# Altium schematic symbol library jlcpcb_2025_04_capacitors_extended_0201.schlib: 1175 symbols (part 7 of 7) (continued)
## V1R5B0201HQC250NAT
designator C?  Capacitance: 1.5pF  (hidden comment: *)
Capacitor, Ceramic (MLCC), 1.5pF, 25V, SMD 0201; Manufacturer: VIIYONG; Manufacturer Part Number: V1R5B0201HQC250NAT; Package Size: 0201; JLCPCB Basic Part: No; JLCPCB Part Number: C2844460; Supplier 1: LCSC; Category: Capacitors - MLCC; Supplier Part Number 1: C2844460; Voltage Rating: 25V; RoHS: Yes; ComponentLink1Description: Datasheet; ComponentLink1URL: https://wmsc.lcsc.com/wmsc/upload/file/pdf/v2/lcsc/2202132030_VIIYONG-V1R5B0201HQC250NAT_C2844460.pdf; ComponentLink2Description: JLCPCB Part URL; ComponentLink2URL: https://jlcpcb.com/partdetail/C2844460; ComponentLink3Description: LCSC Part URL; ComponentLink3URL: https://lcsc.com/product-detail/Multilayer-Ceramic-Capacitors-MLCC---SMD-SMT_VIIYONG-VIIYONG-V1R5B0201HQC250NAT_C2844460.html
footprint CAP-0201 (0201 (0603M) Capacitor)
pins: 1, 2

## V1R5B0201HQC500NAT
designator C?  Capacitance: 1.5pF  (hidden comment: *)
Capacitor, Ceramic (MLCC), 1.5pF, 50V, HQC, SMD 0201; Manufacturer: VIIYONG; Manufacturer Part Number: V1R5B0201HQC500NAT; Package Size: 0201; JLCPCB Basic Part: No; JLCPCB Part Number: C2975895; Supplier 1: LCSC; Category: Capacitors - MLCC; Supplier Part Number 1: C2975895; Voltage Rating: 50V; Temperature Coefficient: HQC; RoHS: Yes; ComponentLink1Description: Datasheet; ComponentLink1URL: https://wmsc.lcsc.com/wmsc/upload/file/pdf/v2/lcsc/2202181430_VIIYONG-V1R5B0201HQC500NAT_C2975895.pdf; ComponentLink2Description: JLCPCB Part URL; ComponentLink2URL: https://jlcpcb.com/partdetail/C2975895; ComponentLink3Description: LCSC Part URL; ComponentLink3URL: https://lcsc.com/product-detail/Multilayer-Ceramic-Capacitors-MLCC---SMD-SMT_VIIYONG-VIIYONG-V1R5B0201HQC500NAT_C2975895.html
footprint CAP-0201 (0201 (0603M) Capacitor)
pins: 1, 2

## V2R7C0201C0G500NAT
designator C?  Capacitance: 2.7pF  (hidden comment: *)
Capacitor, Ceramic (MLCC), 2.7pF, 50V, C0G, SMD 0201; Manufacturer: VIIYONG; Manufacturer Part Number: V2R7C0201C0G500NAT; Package Size: 0201; JLCPCB Basic Part: No; JLCPCB Part Number: C513410; Supplier 1: LCSC; Category: Capacitors - MLCC; Supplier Part Number 1: C513410; Voltage Rating: 50V; Temperature Coefficient: C0G; RoHS: Yes; ComponentLink1Description: Datasheet; ComponentLink1URL: https://wmsc.lcsc.com/wmsc/upload/file/pdf/v2/lcsc/2304140030_VIIYONG-V2R7C0201C0G500NAT_C513410.pdf; ComponentLink2Description: JLCPCB Part URL; ComponentLink2URL: https://jlcpcb.com/partdetail/C513410; ComponentLink3Description: LCSC Part URL; ComponentLink3URL: https://lcsc.com/product-detail/Multilayer-Ceramic-Capacitors-MLCC---SMD-SMT_VIIYONG-VIIYONG-V2R7C0201C0G500NAT_C513410.html
footprint CAP-0201 (0201 (0603M) Capacitor)
pins: 1, 2

## V3R0B0201C0G500NAT
designator C?  Capacitance: 3pF  (hidden comment: *)
Capacitor, Ceramic (MLCC), 3pF, 50V, C0G, SMD 0201; Manufacturer: VIIYONG; Manufacturer Part Number: V3R0B0201C0G500NAT; Package Size: 0201; JLCPCB Basic Part: No; JLCPCB Part Number: C513421; Supplier 1: LCSC; Category: Capacitors - MLCC; Supplier Part Number 1: C513421; Voltage Rating: 50V; Temperature Coefficient: C0G; RoHS: Yes; ComponentLink1Description: Datasheet; ComponentLink1URL: https://wmsc.lcsc.com/wmsc/upload/file/pdf/v2/lcsc/2304140030_VIIYONG-V3R0B0201C0G500NAT_C513421.pdf; ComponentLink2Description: JLCPCB Part URL; ComponentLink2URL: https://jlcpcb.com/partdetail/C513421; ComponentLink3Description: LCSC Part URL; ComponentLink3URL: https://lcsc.com/product-detail/Multilayer-Ceramic-Capacitors-MLCC---SMD-SMT_VIIYONG-VIIYONG-V3R0B0201C0G500NAT_C513421.html
footprint CAP-0201 (0201 (0603M) Capacitor)
pins: 1, 2

## V3R0B0201HQC500NAT
designator C?  Capacitance: 3pF  (hidden comment: *)
Capacitor, Ceramic (MLCC), 3pF, 50V, HQC, SMD 0201; Manufacturer: VIIYONG; Manufacturer Part Number: V3R0B0201HQC500NAT; Package Size: 0201; JLCPCB Basic Part: No; JLCPCB Part Number: C2975894; Supplier 1: LCSC; Category: Capacitors - MLCC; Supplier Part Number 1: C2975894; Voltage Rating: 50V; Temperature Coefficient: HQC; RoHS: Yes; ComponentLink1Description: Datasheet; ComponentLink1URL: https://wmsc.lcsc.com/wmsc/upload/file/pdf/v2/lcsc/2202181430_VIIYONG-V3R0B0201HQC500NAT_C2975894.pdf; ComponentLink2Description: JLCPCB Part URL; ComponentLink2URL: https://jlcpcb.com/partdetail/C2975894; ComponentLink3Description: LCSC Part URL; ComponentLink3URL: https://lcsc.com/product-detail/Multilayer-Ceramic-Capacitors-MLCC---SMD-SMT_VIIYONG-VIIYONG-V3R0B0201HQC500NAT_C2975894.html
footprint CAP-0201 (0201 (0603M) Capacitor)
pins: 1, 2

## V3R0C0201C0G500NAT
designator C?  Capacitance: 3pF  (hidden comment: *)
Capacitor, Ceramic (MLCC), 3pF, 50V, C0G, SMD 0201; Manufacturer: VIIYONG; Manufacturer Part Number: V3R0C0201C0G500NAT; Package Size: 0201; JLCPCB Basic Part: No; JLCPCB Part Number: C525055; Supplier 1: LCSC; Category: Capacitors - MLCC; Supplier Part Number 1: C525055; Voltage Rating: 50V; Temperature Coefficient: C0G; RoHS: Yes; ComponentLink1Description: Datasheet; ComponentLink1URL: https://wmsc.lcsc.com/wmsc/upload/file/pdf/v2/lcsc/2304140030_VIIYONG-V3R0C0201C0G500NAT_C525055.pdf; ComponentLink2Description: JLCPCB Part URL; ComponentLink2URL: https://jlcpcb.com/partdetail/C525055; ComponentLink3Description: LCSC Part URL; ComponentLink3URL: https://lcsc.com/product-detail/Multilayer-Ceramic-Capacitors-MLCC---SMD-SMT_VIIYONG-VIIYONG-V3R0C0201C0G500NAT_C525055.html
footprint CAP-0201 (0201 (0603M) Capacitor)
pins: 1, 2

## V3R6B0201HQC250NAT
designator C?  Capacitance: 3pF  (hidden comment: *)
Capacitor, Ceramic (MLCC), 3pF, 25V, SMD 0201; Manufacturer: VIIYONG; Manufacturer Part Number: V3R6B0201HQC250NAT; Package Size: 0201; JLCPCB Basic Part: No; JLCPCB Part Number: C2844459; Supplier 1: LCSC; Category: Capacitors - MLCC; Supplier Part Number 1: C2844459; Voltage Rating: 25V; RoHS: Yes; ComponentLink1Description: Datasheet; ComponentLink1URL: https://wmsc.lcsc.com/wmsc/upload/file/pdf/v2/lcsc/2202132030_VIIYONG-V3R6B0201HQC250NAT_C2844459.pdf; ComponentLink2Description: JLCPCB Part URL; ComponentLink2URL: https://jlcpcb.com/partdetail/C2844459; ComponentLink3Description: LCSC Part URL; ComponentLink3URL: https://lcsc.com/product-detail/Multilayer-Ceramic-Capacitors-MLCC---SMD-SMT_VIIYONG-VIIYONG-V3R6B0201HQC250NAT_C2844459.html
footprint CAP-0201 (0201 (0603M) Capacitor)
pins: 1, 2

## V4R7C0201C0G500NAT
designator C?  Capacitance: 4.7pF  (hidden comment: *)
Capacitor, Ceramic (MLCC), 4.7pF, 50V, C0G, SMD 0201; Manufacturer: VIIYONG; Manufacturer Part Number: V4R7C0201C0G500NAT; Package Size: 0201; JLCPCB Basic Part: No; JLCPCB Part Number: C513423; Supplier 1: LCSC; Category: Capacitors - MLCC; Supplier Part Number 1: C513423; Voltage Rating: 50V; Temperature Coefficient: C0G; RoHS: Yes; ComponentLink1Description: Datasheet; ComponentLink1URL: https://wmsc.lcsc.com/wmsc/upload/file/pdf/v2/lcsc/2304140030_VIIYONG-V4R7C0201C0G500NAT_C513423.pdf; ComponentLink2Description: JLCPCB Part URL; ComponentLink2URL: https://jlcpcb.com/partdetail/C513423; ComponentLink3Description: LCSC Part URL; ComponentLink3URL: https://lcsc.com/product-detail/Multilayer-Ceramic-Capacitors-MLCC---SMD-SMT_VIIYONG-VIIYONG-V4R7C0201C0G500NAT_C513423.html
footprint CAP-0201 (0201 (0603M) Capacitor)
pins: 1, 2

## V5R0B0201C0G500NAT
designator C?  Capacitance: 5pF  (hidden comment: *)
Capacitor, Ceramic (MLCC), 5pF, 50V, C0G, SMD 0201; Manufacturer: VIIYONG; Manufacturer Part Number: V5R0B0201C0G500NAT; Package Size: 0201; JLCPCB Basic Part: No; JLCPCB Part Number: C609980; Supplier 1: LCSC; Category: Capacitors - MLCC; Supplier Part Number 1: C609980; Voltage Rating: 50V; Temperature Coefficient: C0G; RoHS: Yes; ComponentLink1Description: Datasheet; ComponentLink1URL: https://wmsc.lcsc.com/wmsc/upload/file/pdf/v2/lcsc/2304140030_VIIYONG-V5R0B0201C0G500NAT_C609980.pdf; ComponentLink2Description: JLCPCB Part URL; ComponentLink2URL: https://jlcpcb.com/partdetail/C609980; ComponentLink3Description: LCSC Part URL; ComponentLink3URL: https://lcsc.com/product-detail/Multilayer-Ceramic-Capacitors-MLCC---SMD-SMT_VIIYONG-VIIYONG-V5R0B0201C0G500NAT_C609980.html
footprint CAP-0201 (0201 (0603M) Capacitor)
pins: 1, 2

## V7R0C0201C0G500NAT
designator C?  Capacitance: 7pF  (hidden comment: *)
Capacitor, Ceramic (MLCC), 7pF, 50V, C0G, SMD 0201; Manufacturer: VIIYONG; Manufacturer Part Number: V7R0C0201C0G500NAT; Package Size: 0201; JLCPCB Basic Part: No; JLCPCB Part Number: C525059; Supplier 1: LCSC; Category: Capacitors - MLCC; Supplier Part Number 1: C525059; Voltage Rating: 50V; Temperature Coefficient: C0G; RoHS: Yes; ComponentLink1Description: Datasheet; ComponentLink1URL: https://wmsc.lcsc.com/wmsc/upload/file/pdf/v2/lcsc/2304140030_VIIYONG-V7R0C0201C0G500NAT_C525059.pdf; ComponentLink2Description: JLCPCB Part URL; ComponentLink2URL: https://jlcpcb.com/partdetail/C525059; ComponentLink3Description: LCSC Part URL; ComponentLink3URL: https://lcsc.com/product-detail/Multilayer-Ceramic-Capacitors-MLCC---SMD-SMT_VIIYONG-VIIYONG-V7R0C0201C0G500NAT_C525059.html
footprint CAP-0201 (0201 (0603M) Capacitor)
pins: 1, 2

## V7R0D0201C0G500NAT
designator C?  Capacitance: 7pF  (hidden comment: *)
Capacitor, Ceramic (MLCC), 7pF, 50V, C0G, SMD 0201; Manufacturer: VIIYONG; Manufacturer Part Number: V7R0D0201C0G500NAT; Package Size: 0201; JLCPCB Basic Part: No; JLCPCB Part Number: C525060; Supplier 1: LCSC; Category: Capacitors - MLCC; Supplier Part Number 1: C525060; Voltage Rating: 50V; Temperature Coefficient: C0G; RoHS: Yes; ComponentLink1Description: Datasheet; ComponentLink1URL: https://wmsc.lcsc.com/wmsc/upload/file/pdf/v2/lcsc/2304140030_VIIYONG-V7R0D0201C0G500NAT_C525060.pdf; ComponentLink2Description: JLCPCB Part URL; ComponentLink2URL: https://jlcpcb.com/partdetail/C525060; ComponentLink3Description: LCSC Part URL; ComponentLink3URL: https://lcsc.com/product-detail/Multilayer-Ceramic-Capacitors-MLCC---SMD-SMT_VIIYONG-VIIYONG-V7R0D0201C0G500NAT_C525060.html
footprint CAP-0201 (0201 (0603M) Capacitor)
pins: 1, 2

## V100J0201HQC500NAT
designator C?  Capacitance: 10pF  (hidden comment: *)
Capacitor, Ceramic (MLCC), 10pF, ±5%, 50V, HQC, ±5%, SMD 0201; Manufacturer: VIIYONG; Manufacturer Part Number: V100J0201HQC500NAT; Package Size: 0201; JLCPCB Basic Part: No; JLCPCB Part Number: C2975899; Supplier 1: LCSC; Category: Capacitors - MLCC; Supplier Part Number 1: C2975899; Tolerance: ±5%; Voltage Rating: 50V; Temperature Coefficient: HQC; RoHS: Yes; ComponentLink1Description: Datasheet; ComponentLink1URL: https://wmsc.lcsc.com/wmsc/upload/file/pdf/v2/lcsc/2202181430_VIIYONG-V100J0201HQC500NAT_C2975899.pdf; ComponentLink2Description: JLCPCB Part URL; ComponentLink2URL: https://jlcpcb.com/partdetail/C2975899; ComponentLink3Description: LCSC Part URL; ComponentLink3URL: https://lcsc.com/product-detail/Multilayer-Ceramic-Capacitors-MLCC---SMD-SMT_VIIYONG-VIIYONG-V100J0201HQC500NAT_C2975899.html
footprint CAP-0201 (0201 (0603M) Capacitor)
pins: 1, 2

## V102K0201X7R500NAT
designator C?  Capacitance: 1nF  (hidden comment: *)
Capacitor, Ceramic (MLCC), 1nF, ±10%, 50V, X7R, ±10%, SMD 0201; Manufacturer: VIIYONG; Manufacturer Part Number: V102K0201X7R500NAT; Package Size: 0201; JLCPCB Basic Part: No; JLCPCB Part Number: C513404; Supplier 1: LCSC; Category: Capacitors - MLCC; Supplier Part Number 1: C513404; Tolerance: ±10%; Voltage Rating: 50V; Temperature Coefficient: X7R; RoHS: Yes; ComponentLink1Description: Datasheet; ComponentLink1URL: https://wmsc.lcsc.com/wmsc/upload/file/pdf/v2/lcsc/2304140030_VIIYONG-V102K0201X7R500NAT_C513404.pdf; ComponentLink2Description: JLCPCB Part URL; ComponentLink2URL: https://jlcpcb.com/partdetail/C513404; ComponentLink3Description: LCSC Part URL; ComponentLink3URL: https://lcsc.com/product-detail/Multilayer-Ceramic-Capacitors-MLCC---SMD-SMT_VIIYONG-VIIYONG-V102K0201X7R500NAT_C513404.html
footprint CAP-0201 (0201 (0603M) Capacitor)
pins: 1, 2

## V103K0201X7R160NAT
designator C?  Capacitance: 10nF  (hidden comment: *)
Capacitor, Ceramic (MLCC), 10nF, ±10%, 16V, ±10%, SMD 0201; Manufacturer: VIIYONG; Manufacturer Part Number: V103K0201X7R160NAT; Package Size: 0201; JLCPCB Basic Part: No; JLCPCB Part Number: C2841454; Supplier 1: LCSC; Category: Capacitors - MLCC; Supplier Part Number 1: C2841454; Tolerance: ±10%; Voltage Rating: 16V; RoHS: Yes; ComponentLink1Description: Datasheet; ComponentLink1URL: https://wmsc.lcsc.com/wmsc/upload/file/pdf/v2/lcsc/2202132030_VIIYONG-V103K0201X7R160NAT_C2841454.pdf; ComponentLink2Description: JLCPCB Part URL; ComponentLink2URL: https://jlcpcb.com/partdetail/C2841454; ComponentLink3Description: LCSC Part URL; ComponentLink3URL: https://lcsc.com/product-detail/Multilayer-Ceramic-Capacitors-MLCC---SMD-SMT_VIIYONG-VIIYONG-V103K0201X7R160NAT_C2841454.html
footprint CAP-0201 (0201 (0603M) Capacitor)
pins: 1, 2

## V104K0201X5R250NJT
designator C?  Capacitance: 100nF  (hidden comment: *)
Capacitor, Ceramic (MLCC), 100nF, 25V, SMD 0201; Manufacturer: VIIYONG; Manufacturer Part Number: V104K0201X5R250NJT; Package Size: 0201; JLCPCB Basic Part: No; JLCPCB Part Number: C2844462; Supplier 1: LCSC; Category: Capacitors - MLCC; Supplier Part Number 1: C2844462; Voltage Rating: 25V; RoHS: Yes; ComponentLink1Description: Datasheet; ComponentLink1URL: https://wmsc.lcsc.com/wmsc/upload/file/pdf/v2/lcsc/2202132030_VIIYONG-V104K0201X5R250NJT_C2844462.pdf; ComponentLink2Description: JLCPCB Part URL; ComponentLink2URL: https://jlcpcb.com/partdetail/C2844462; ComponentLink3Description: LCSC Part URL; ComponentLink3URL: https://lcsc.com/product-detail/Multilayer-Ceramic-Capacitors-MLCC---SMD-SMT_VIIYONG-VIIYONG-V104K0201X5R250NJT_C2844462.html
footprint CAP-0201 (0201 (0603M) Capacitor)
pins: 1, 2

## V104M0201X5R6R3NAT
designator C?  Capacitance: 100nF  (hidden comment: *)
Capacitor, Ceramic (MLCC), 100nF, ±20%, 6.3V, ±20%, SMD 0201; Manufacturer: VIIYONG; Manufacturer Part Number: V104M0201X5R6R3NAT; Package Size: 0201; JLCPCB Basic Part: No; JLCPCB Part Number: C2841453; Supplier 1: LCSC; Category: Capacitors - MLCC; Supplier Part Number 1: C2841453; Tolerance: ±20%; Voltage Rating: 6.3V; RoHS: Yes; ComponentLink1Description: Datasheet; ComponentLink1URL: https://wmsc.lcsc.com/wmsc/upload/file/pdf/v2/lcsc/2202132030_VIIYONG-V104M0201X5R6R3NAT_C2841453.pdf; ComponentLink2Description: JLCPCB Part URL; ComponentLink2URL: https://jlcpcb.com/partdetail/C2841453; ComponentLink3Description: LCSC Part URL; ComponentLink3URL: https://lcsc.com/product-detail/Multilayer-Ceramic-Capacitors-MLCC---SMD-SMT_VIIYONG-VIIYONG-V104M0201X5R6R3NAT_C2841453.html
footprint CAP-0201 (0201 (0603M) Capacitor)
pins: 1, 2

## V105M0201X5R6R3NXT
designator C?  Capacitance: 1uF  (hidden comment: *)
Capacitor, Ceramic (MLCC), 1uF, ±20%, 6.3V, X5R, ±20%, SMD 0201; Manufacturer: VIIYONG; Manufacturer Part Number: V105M0201X5R6R3NXT; Package Size: 0201; JLCPCB Basic Part: No; JLCPCB Part Number: C610030; Supplier 1: LCSC; Category: Capacitors - MLCC; Supplier Part Number 1: C610030; Tolerance: ±20%; Voltage Rating: 6.3V; Temperature Coefficient: X5R; RoHS: Yes; ComponentLink1Description: Datasheet; ComponentLink1URL: https://wmsc.lcsc.com/wmsc/upload/file/pdf/v2/lcsc/2203261130_VIIYONG-V105M0201X5R6R3NXT_C610030.pdf; ComponentLink2Description: JLCPCB Part URL; ComponentLink2URL: https://jlcpcb.com/partdetail/C610030; ComponentLink3Description: LCSC Part URL; ComponentLink3URL: https://lcsc.com/product-detail/Multilayer-Ceramic-Capacitors-MLCC---SMD-SMT_VIIYONG-VIIYONG-V105M0201X5R6R3NXT_C610030.html
footprint CAP-0201 (0201 (0603M) Capacitor)
pins: 1, 2

## V105M0201X5R100NXT
designator C?  Capacitance: 1uF  (hidden comment: *)
Capacitor, Ceramic (MLCC), 1uF, 10V, X5R, SMD 0201; Manufacturer: VIIYONG; Manufacturer Part Number: V105M0201X5R100NXT; Package Size: 0201; JLCPCB Basic Part: No; JLCPCB Part Number: C2980387; Supplier 1: LCSC; Category: Capacitors - MLCC; Supplier Part Number 1: C2980387; Voltage Rating: 10V; Temperature Coefficient: X5R; RoHS: Yes; ComponentLink1Description: Datasheet; ComponentLink1URL: https://wmsc.lcsc.com/wmsc/upload/file/pdf/v2/lcsc/2203041530_VIIYONG-V105M0201X5R100NXT_C2980387.pdf; ComponentLink2Description: JLCPCB Part URL; ComponentLink2URL: https://jlcpcb.com/partdetail/C2980387; ComponentLink3Description: LCSC Part URL; ComponentLink3URL: https://lcsc.com/product-detail/Multilayer-Ceramic-Capacitors-MLCC---SMD-SMT_VIIYONG-VIIYONG-V105M0201X5R100NXT_C2980387.html
footprint CAP-0201 (0201 (0603M) Capacitor)
pins: 1, 2

## V120K0201C0G250NAT
designator C?  Capacitance: 12pF  (hidden comment: *)
Capacitor, Ceramic (MLCC), 12pF, ±10%, 25V, C0G, ±10%, SMD 0201; Manufacturer: VIIYONG; Manufacturer Part Number: V120K0201C0G250NAT; Package Size: 0201; JLCPCB Basic Part: No; JLCPCB Part Number: C525066; Supplier 1: LCSC; Category: Capacitors - MLCC; Supplier Part Number 1: C525066; Tolerance: ±10%; Voltage Rating: 25V; Temperature Coefficient: C0G; RoHS: Yes; ComponentLink1Description: Datasheet; ComponentLink1URL: https://wmsc.lcsc.com/wmsc/upload/file/pdf/v2/lcsc/2304140030_VIIYONG-V120K0201C0G250NAT_C525066.pdf; ComponentLink2Description: JLCPCB Part URL; ComponentLink2URL: https://jlcpcb.com/partdetail/C525066; ComponentLink3Description: LCSC Part URL; ComponentLink3URL: https://lcsc.com/product-detail/Multilayer-Ceramic-Capacitors-MLCC---SMD-SMT_VIIYONG-VIIYONG-V120K0201C0G250NAT_C525066.html
footprint CAP-0201 (0201 (0603M) Capacitor)
pins: 1, 2

## V121K0201C0G500NAT
designator C?  Capacitance: 120pF  (hidden comment: *)
Capacitor, Ceramic (MLCC), 120pF, ±10%, 50V, C0G, ±10%, SMD 0201; Manufacturer: VIIYONG; Manufacturer Part Number: V121K0201C0G500NAT; Package Size: 0201; JLCPCB Basic Part: No; JLCPCB Part Number: C525080; Supplier 1: LCSC; Category: Capacitors - MLCC; Supplier Part Number 1: C525080; Tolerance: ±10%; Voltage Rating: 50V; Temperature Coefficient: C0G; RoHS: Yes; ComponentLink1Description: Datasheet; ComponentLink2Description: JLCPCB Part URL; ComponentLink2URL: https://jlcpcb.com/partdetail/C525080; ComponentLink3Description: LCSC Part URL; ComponentLink3URL: https://lcsc.com/product-detail/Multilayer-Ceramic-Capacitors-MLCC---SMD-SMT_VIIYONG-VIIYONG-V121K0201C0G500NAT_C525080.html
footprint CAP-0201 (0201 (0603M) Capacitor)
pins: 1, 2

## V122K0201X7R500NAT
designator C?  Capacitance: 1.2nF  (hidden comment: *)
Capacitor, Ceramic (MLCC), 1.2nF, ±10%, 50V, ±10%, SMD 0201; Manufacturer: VIIYONG; Manufacturer Part Number: V122K0201X7R500NAT; Package Size: 0201; JLCPCB Basic Part: No; JLCPCB Part Number: C610012; Supplier 1: LCSC; Category: Capacitors - MLCC; Supplier Part Number 1: C610012; Tolerance: ±10%; Voltage Rating: 50V; RoHS: Yes; ComponentLink1Description: Datasheet; ComponentLink1URL: https://wmsc.lcsc.com/wmsc/upload/file/pdf/v2/lcsc/2304140030_VIIYONG-V122K0201X7R500NAT_C610012.pdf; ComponentLink2Description: JLCPCB Part URL; ComponentLink2URL: https://jlcpcb.com/partdetail/C610012; ComponentLink3Description: LCSC Part URL; ComponentLink3URL: https://lcsc.com/product-detail/Multilayer-Ceramic-Capacitors-MLCC---SMD-SMT_VIIYONG-VIIYONG-V122K0201X7R500NAT_C610012.html
footprint CAP-0201 (0201 (0603M) Capacitor)
pins: 1, 2

## V124K0201X5R100NAT
designator C?  Capacitance: 120nF  (hidden comment: *)
Capacitor, Ceramic (MLCC), 120nF, ±10%, 10V, X5R, ±10%, SMD 0201; Manufacturer: VIIYONG; Manufacturer Part Number: V124K0201X5R100NAT; Package Size: 0201; JLCPCB Basic Part: No; JLCPCB Part Number: C525095; Supplier 1: LCSC; Category: Capacitors - MLCC; Supplier Part Number 1: C525095; Tolerance: ±10%; Voltage Rating: 10V; Temperature Coefficient: X5R; RoHS: Yes; ComponentLink1Description: Datasheet; ComponentLink1URL: https://wmsc.lcsc.com/wmsc/upload/file/pdf/v2/lcsc/2304140030_VIIYONG-V124K0201X5R100NAT_C525095.pdf; ComponentLink2Description: JLCPCB Part URL; ComponentLink2URL: https://jlcpcb.com/partdetail/C525095; ComponentLink3Description: LCSC Part URL; ComponentLink3URL: https://lcsc.com/product-detail/Multilayer-Ceramic-Capacitors-MLCC---SMD-SMT_VIIYONG-VIIYONG-V124K0201X5R100NAT_C525095.html
footprint CAP-0201 (0201 (0603M) Capacitor)
pins: 1, 2

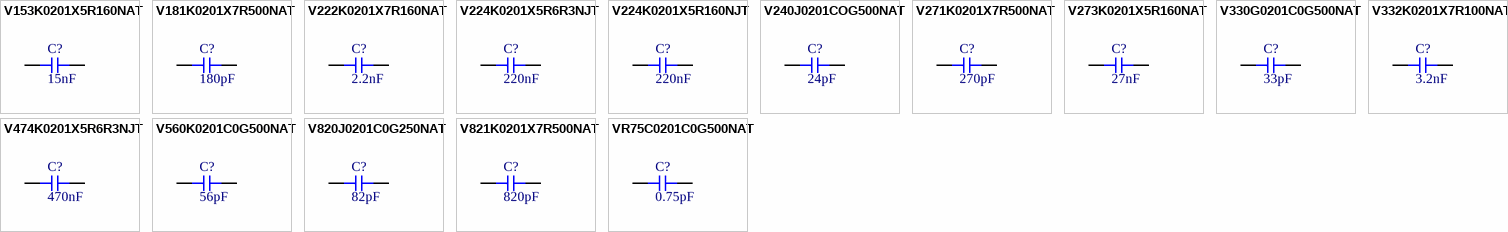
[diagram p29: symbols V153K0201X5R160NAT to VR75C0201C0G500NAT]

## V153K0201X5R160NAT
designator C?  Capacitance: 15nF  (hidden comment: *)
Capacitor, Ceramic (MLCC), 15nF, ±10%, 16V, X5R, ±10%, SMD 0201; Manufacturer: VIIYONG; Manufacturer Part Number: V153K0201X5R160NAT; Package Size: 0201; JLCPCB Basic Part: No; JLCPCB Part Number: C513401; Supplier 1: LCSC; Category: Capacitors - MLCC; Supplier Part Number 1: C513401; Tolerance: ±10%; Voltage Rating: 16V; Temperature Coefficient: X5R; RoHS: Yes; ComponentLink1Description: Datasheet; ComponentLink1URL: https://wmsc.lcsc.com/wmsc/upload/file/pdf/v2/lcsc/2304140030_VIIYONG-V153K0201X5R160NAT_C513401.pdf; ComponentLink2Description: JLCPCB Part URL; ComponentLink2URL: https://jlcpcb.com/partdetail/C513401; ComponentLink3Description: LCSC Part URL; ComponentLink3URL: https://lcsc.com/product-detail/Multilayer-Ceramic-Capacitors-MLCC---SMD-SMT_VIIYONG-VIIYONG-V153K0201X5R160NAT_C513401.html
footprint CAP-0201 (0201 (0603M) Capacitor)
pins: 1, 2

## V181K0201X7R500NAT
designator C?  Capacitance: 180pF  (hidden comment: *)
Capacitor, Ceramic (MLCC), 180pF, ±10%, 50V, X7R, ±10%, SMD 0201; Manufacturer: VIIYONG; Manufacturer Part Number: V181K0201X7R500NAT; Package Size: 0201; JLCPCB Basic Part: No; JLCPCB Part Number: C610010; Supplier 1: LCSC; Category: Capacitors - MLCC; Supplier Part Number 1: C610010; Tolerance: ±10%; Voltage Rating: 50V; Temperature Coefficient: X7R; RoHS: Yes; ComponentLink1Description: Datasheet; ComponentLink1URL: https://wmsc.lcsc.com/wmsc/upload/file/pdf/v2/lcsc/2304140030_VIIYONG-V181K0201X7R500NAT_C610010.pdf; ComponentLink2Description: JLCPCB Part URL; ComponentLink2URL: https://jlcpcb.com/partdetail/C610010; ComponentLink3Description: LCSC Part URL; ComponentLink3URL: https://lcsc.com/product-detail/Multilayer-Ceramic-Capacitors-MLCC---SMD-SMT_VIIYONG-VIIYONG-V181K0201X7R500NAT_C610010.html
footprint CAP-0201 (0201 (0603M) Capacitor)
pins: 1, 2

## V222K0201X7R160NAT
designator C?  Capacitance: 2.2nF  (hidden comment: *)
Capacitor, Ceramic (MLCC), 2.2nF, ±10%, 16V, X7R, ±10%, SMD 0201; Manufacturer: VIIYONG; Manufacturer Part Number: V222K0201X7R160NAT; Package Size: 0201; JLCPCB Basic Part: No; JLCPCB Part Number: C525083; Supplier 1: LCSC; Category: Capacitors - MLCC; Supplier Part Number 1: C525083; Tolerance: ±10%; Voltage Rating: 16V; Temperature Coefficient: X7R; RoHS: Yes; ComponentLink1Description: Datasheet; ComponentLink2Description: JLCPCB Part URL; ComponentLink2URL: https://jlcpcb.com/partdetail/C525083; ComponentLink3Description: LCSC Part URL; ComponentLink3URL: https://lcsc.com/product-detail/Multilayer-Ceramic-Capacitors-MLCC---SMD-SMT_VIIYONG-VIIYONG-V222K0201X7R160NAT_C525083.html
footprint CAP-0201 (0201 (0603M) Capacitor)
pins: 1, 2

## V224K0201X5R6R3NJT
designator C?  Capacitance: 220nF  (hidden comment: *)
Capacitor, Ceramic (MLCC), 220nF, ±10%, 6.3V, ±10%, SMD 0201; Manufacturer: VIIYONG; Manufacturer Part Number: V224K0201X5R6R3NJT; Package Size: 0201; JLCPCB Basic Part: No; JLCPCB Part Number: C962109; Supplier 1: LCSC; Category: Capacitors - MLCC; Supplier Part Number 1: C962109; Tolerance: ±10%; Voltage Rating: 6.3V; RoHS: Yes; ComponentLink1Description: Datasheet; ComponentLink1URL: https://wmsc.lcsc.com/wmsc/upload/file/pdf/v2/lcsc/2304140030_VIIYONG-V224K0201X5R6R3NJT_C962109.pdf; ComponentLink2Description: JLCPCB Part URL; ComponentLink2URL: https://jlcpcb.com/partdetail/C962109; ComponentLink3Description: LCSC Part URL; ComponentLink3URL: https://lcsc.com/product-detail/Multilayer-Ceramic-Capacitors-MLCC---SMD-SMT_VIIYONG-VIIYONG-V224K0201X5R6R3NJT_C962109.html
footprint CAP-0201 (0201 (0603M) Capacitor)
pins: 1, 2

## V224K0201X5R160NJT
designator C?  Capacitance: 220nF  (hidden comment: *)
Capacitor, Ceramic (MLCC), 220nF, ±10%, 16V, X5R, ±10%, SMD 0201; Manufacturer: VIIYONG; Manufacturer Part Number: V224K0201X5R160NJT; Package Size: 0201; JLCPCB Basic Part: No; JLCPCB Part Number: C3009904; Supplier 1: LCSC; Category: Capacitors - MLCC; Supplier Part Number 1: C3009904; Tolerance: ±10%; Voltage Rating: 16V; Temperature Coefficient: X5R; RoHS: Yes; ComponentLink1Description: Datasheet; ComponentLink1URL: https://wmsc.lcsc.com/wmsc/upload/file/pdf/v2/lcsc/2205171730_VIIYONG-V224K0201X5R160NJT_C3009904.pdf; ComponentLink2Description: JLCPCB Part URL; ComponentLink2URL: https://jlcpcb.com/partdetail/C3009904; ComponentLink3Description: LCSC Part URL; ComponentLink3URL: https://lcsc.com/product-detail/Multilayer-Ceramic-Capacitors-MLCC---SMD-SMT_VIIYONG-VIIYONG-V224K0201X5R160NJT_C3009904.html
footprint CAP-0201 (0201 (0603M) Capacitor)
pins: 1, 2

## V240J0201COG500NAT
designator C?  Capacitance: 24pF  (hidden comment: *)
Capacitor, Ceramic (MLCC), 24pF, ±5%, 50V, C0G, ±5%, SMD 0201; Manufacturer: VIIYONG; Manufacturer Part Number: V240J0201COG500NAT; Package Size: 0201; JLCPCB Basic Part: No; JLCPCB Part Number: C609923; Supplier 1: LCSC; Category: Capacitors - MLCC; Supplier Part Number 1: C609923; Tolerance: ±5%; Voltage Rating: 50V; Temperature Coefficient: C0G; RoHS: Yes; ComponentLink1Description: Datasheet; ComponentLink1URL: https://wmsc.lcsc.com/wmsc/upload/file/pdf/v2/lcsc/2304140030_VIIYONG-V240J0201COG500NAT_C609923.pdf; ComponentLink2Description: JLCPCB Part URL; ComponentLink2URL: https://jlcpcb.com/partdetail/C609923; ComponentLink3Description: LCSC Part URL; ComponentLink3URL: https://lcsc.com/product-detail/Multilayer-Ceramic-Capacitors-MLCC---SMD-SMT_VIIYONG-VIIYONG-V240J0201COG500NAT_C609923.html
footprint CAP-0201 (0201 (0603M) Capacitor)
pins: 1, 2

## V271K0201X7R500NAT
designator C?  Capacitance: 270pF  (hidden comment: *)
Capacitor, Ceramic (MLCC), 270pF, ±10%, 50V, X7R, ±10%, SMD 0201; Manufacturer: VIIYONG; Manufacturer Part Number: V271K0201X7R500NAT; Package Size: 0201; JLCPCB Basic Part: No; JLCPCB Part Number: C525082; Supplier 1: LCSC; Category: Capacitors - MLCC; Supplier Part Number 1: C525082; Tolerance: ±10%; Voltage Rating: 50V; Temperature Coefficient: X7R; RoHS: Yes; ComponentLink1Description: Datasheet; ComponentLink1URL: https://wmsc.lcsc.com/wmsc/upload/file/pdf/v2/lcsc/2304140030_VIIYONG-V271K0201X7R500NAT_C525082.pdf; ComponentLink2Description: JLCPCB Part URL; ComponentLink2URL: https://jlcpcb.com/partdetail/C525082; ComponentLink3Description: LCSC Part URL; ComponentLink3URL: https://lcsc.com/product-detail/Multilayer-Ceramic-Capacitors-MLCC---SMD-SMT_VIIYONG-VIIYONG-V271K0201X7R500NAT_C525082.html
footprint CAP-0201 (0201 (0603M) Capacitor)
pins: 1, 2

## V273K0201X5R160NAT
designator C?  Capacitance: 27nF  (hidden comment: *)
Capacitor, Ceramic (MLCC), 27nF, ±10%, 16V, X5R, ±10%, SMD 0201; Manufacturer: VIIYONG; Manufacturer Part Number: V273K0201X5R160NAT; Package Size: 0201; JLCPCB Basic Part: No; JLCPCB Part Number: C525091; Supplier 1: LCSC; Category: Capacitors - MLCC; Supplier Part Number 1: C525091; Tolerance: ±10%; Voltage Rating: 16V; Temperature Coefficient: X5R; RoHS: Yes; ComponentLink1Description: Datasheet; ComponentLink1URL: https://wmsc.lcsc.com/wmsc/upload/file/pdf/v2/lcsc/2304140030_VIIYONG-V273K0201X5R160NAT_C525091.pdf; ComponentLink2Description: JLCPCB Part URL; ComponentLink2URL: https://jlcpcb.com/partdetail/C525091; ComponentLink3Description: LCSC Part URL; ComponentLink3URL: https://lcsc.com/product-detail/Multilayer-Ceramic-Capacitors-MLCC---SMD-SMT_VIIYONG-VIIYONG-V273K0201X5R160NAT_C525091.html
footprint CAP-0201 (0201 (0603M) Capacitor)
pins: 1, 2

## V330G0201C0G500NAT
designator C?  Capacitance: 33pF  (hidden comment: *)
Capacitor, Ceramic (MLCC), 33pF, ±2%, 50V, C0G, ±2%, SMD 0201; Manufacturer: VIIYONG; Manufacturer Part Number: V330G0201C0G500NAT; Package Size: 0201; JLCPCB Basic Part: No; JLCPCB Part Number: C2975900; Supplier 1: LCSC; Category: Capacitors - MLCC; Supplier Part Number 1: C2975900; Tolerance: ±2%; Voltage Rating: 50V; Temperature Coefficient: C0G; RoHS: Yes; ComponentLink1Description: Datasheet; ComponentLink1URL: https://wmsc.lcsc.com/wmsc/upload/file/pdf/v2/lcsc/2202181430_VIIYONG-V330G0201C0G500NAT_C2975900.pdf; ComponentLink2Description: JLCPCB Part URL; ComponentLink2URL: https://jlcpcb.com/partdetail/C2975900; ComponentLink3Description: LCSC Part URL; ComponentLink3URL: https://lcsc.com/product-detail/Multilayer-Ceramic-Capacitors-MLCC---SMD-SMT_VIIYONG-VIIYONG-V330G0201C0G500NAT_C2975900.html
footprint CAP-0201 (0201 (0603M) Capacitor)
pins: 1, 2

## V332K0201X7R100NAT
designator C?  Capacitance: 3.2nF  (hidden comment: *)
Capacitor, Ceramic (MLCC), 3.2nF, ±10%, 10V, X7R, ±10%, SMD 0201; Manufacturer: VIIYONG; Manufacturer Part Number: V332K0201X7R100NAT; Package Size: 0201; JLCPCB Basic Part: No; JLCPCB Part Number: C525085; Supplier 1: LCSC; Category: Capacitors - MLCC; Supplier Part Number 1: C525085; Tolerance: ±10%; Voltage Rating: 10V; Temperature Coefficient: X7R; RoHS: Yes; ComponentLink1Description: Datasheet; ComponentLink1URL: https://wmsc.lcsc.com/wmsc/upload/file/pdf/v2/lcsc/2304140030_VIIYONG-V332K0201X7R100NAT_C525085.pdf; ComponentLink2Description: JLCPCB Part URL; ComponentLink2URL: https://jlcpcb.com/partdetail/C525085; ComponentLink3Description: LCSC Part URL; ComponentLink3URL: https://lcsc.com/product-detail/Multilayer-Ceramic-Capacitors-MLCC---SMD-SMT_VIIYONG-VIIYONG-V332K0201X7R100NAT_C525085.html
footprint CAP-0201 (0201 (0603M) Capacitor)
pins: 1, 2

## V474K0201X5R6R3NJT
designator C?  Capacitance: 470nF  (hidden comment: *)
Capacitor, Ceramic (MLCC), 470nF, ±10%, 6.3V, ±10%, SMD 0201; Manufacturer: VIIYONG; Manufacturer Part Number: V474K0201X5R6R3NJT; Package Size: 0201; JLCPCB Basic Part: No; JLCPCB Part Number: C962111; Supplier 1: LCSC; Category: Capacitors - MLCC; Supplier Part Number 1: C962111; Tolerance: ±10%; Voltage Rating: 6.3V; RoHS: Yes; ComponentLink1Description: Datasheet; ComponentLink1URL: https://wmsc.lcsc.com/wmsc/upload/file/pdf/v2/lcsc/2304140030_VIIYONG-V474K0201X5R6R3NJT_C962111.pdf; ComponentLink2Description: JLCPCB Part URL; ComponentLink2URL: https://jlcpcb.com/partdetail/C962111; ComponentLink3Description: LCSC Part URL; ComponentLink3URL: https://lcsc.com/product-detail/Multilayer-Ceramic-Capacitors-MLCC---SMD-SMT_VIIYONG-VIIYONG-V474K0201X5R6R3NJT_C962111.html
footprint CAP-0201 (0201 (0603M) Capacitor)
pins: 1, 2

## V560K0201C0G500NAT
designator C?  Capacitance: 56pF  (hidden comment: *)
Capacitor, Ceramic (MLCC), 56pF, ±10%, 50V, C0G, ±10%, SMD 0201; Manufacturer: VIIYONG; Manufacturer Part Number: V560K0201C0G500NAT; Package Size: 0201; JLCPCB Basic Part: No; JLCPCB Part Number: C525077; Supplier 1: LCSC; Category: Capacitors - MLCC; Supplier Part Number 1: C525077; Tolerance: ±10%; Voltage Rating: 50V; Temperature Coefficient: C0G; RoHS: Yes; ComponentLink1Description: Datasheet; ComponentLink2Description: JLCPCB Part URL; ComponentLink2URL: https://jlcpcb.com/partdetail/C525077; ComponentLink3Description: LCSC Part URL; ComponentLink3URL: https://lcsc.com/product-detail/Multilayer-Ceramic-Capacitors-MLCC---SMD-SMT_VIIYONG-VIIYONG-V560K0201C0G500NAT_C525077.html
footprint CAP-0201 (0201 (0603M) Capacitor)
pins: 1, 2

## V820J0201C0G250NAT
designator C?  Capacitance: 82pF  (hidden comment: *)
Capacitor, Ceramic (MLCC), 82pF, ±5%, 25V, C0G, ±5%, SMD 0201; Manufacturer: VIIYONG; Manufacturer Part Number: V820J0201C0G250NAT; Package Size: 0201; JLCPCB Basic Part: No; JLCPCB Part Number: C525078; Supplier 1: LCSC; Category: Capacitors - MLCC; Supplier Part Number 1: C525078; Tolerance: ±5%; Voltage Rating: 25V; Temperature Coefficient: C0G; RoHS: Yes; ComponentLink1Description: Datasheet; ComponentLink2Description: JLCPCB Part URL; ComponentLink2URL: https://jlcpcb.com/partdetail/C525078; ComponentLink3Description: LCSC Part URL; ComponentLink3URL: https://lcsc.com/product-detail/Multilayer-Ceramic-Capacitors-MLCC---SMD-SMT_VIIYONG-VIIYONG-V820J0201C0G250NAT_C525078.html
footprint CAP-0201 (0201 (0603M) Capacitor)
pins: 1, 2

## V821K0201X7R500NAT
designator C?  Capacitance: 820pF  (hidden comment: *)
Capacitor, Ceramic (MLCC), 820pF, ±10%, 50V, X7R, ±10%, SMD 0201; Manufacturer: VIIYONG; Manufacturer Part Number: V821K0201X7R500NAT; Package Size: 0201; JLCPCB Basic Part: No; JLCPCB Part Number: C609925; Supplier 1: LCSC; Category: Capacitors - MLCC; Supplier Part Number 1: C609925; Tolerance: ±10%; Voltage Rating: 50V; Temperature Coefficient: X7R; RoHS: Yes; ComponentLink1Description: Datasheet; ComponentLink1URL: https://wmsc.lcsc.com/wmsc/upload/file/pdf/v2/lcsc/2304140030_VIIYONG-V821K0201X7R500NAT_C609925.pdf; ComponentLink2Description: JLCPCB Part URL; ComponentLink2URL: https://jlcpcb.com/partdetail/C609925; ComponentLink3Description: LCSC Part URL; ComponentLink3URL: https://lcsc.com/product-detail/Multilayer-Ceramic-Capacitors-MLCC---SMD-SMT_VIIYONG-VIIYONG-V821K0201X7R500NAT_C609925.html
footprint CAP-0201 (0201 (0603M) Capacitor)
pins: 1, 2

## VR75C0201C0G500NAT
designator C?  Capacitance: 0.75pF  (hidden comment: *)
Capacitor, Ceramic (MLCC), 0.75pF, 50V, C0G, SMD 0201; Manufacturer: VIIYONG; Manufacturer Part Number: VR75C0201C0G500NAT; Package Size: 0201; JLCPCB Basic Part: No; JLCPCB Part Number: C609962; Supplier 1: LCSC; Category: Capacitors - MLCC; Supplier Part Number 1: C609962; Voltage Rating: 50V; Temperature Coefficient: C0G; RoHS: Yes; ComponentLink1Description: Datasheet; ComponentLink1URL: https://wmsc.lcsc.com/wmsc/upload/file/pdf/v2/lcsc/2304140030_VIIYONG-VR75C0201C0G500NAT_C609962.pdf; ComponentLink2Description: JLCPCB Part URL; ComponentLink2URL: https://jlcpcb.com/partdetail/C609962; ComponentLink3Description: LCSC Part URL; ComponentLink3URL: https://lcsc.com/product-detail/Multilayer-Ceramic-Capacitors-MLCC---SMD-SMT_VIIYONG-VIIYONG-VR75C0201C0G500NAT_C609962.html
footprint CAP-0201 (0201 (0603M) Capacitor)
pins: 1, 2